# Altium footprint library klp.PcbLib: 436 footprints (part 7 of 28)
Each footprint in its own frame and in the unit in brackets; x right, y up, seen from the top. Pads: shape width x height; smd on the part's side, far side on the other; paste and mask are expansions set on the pad; w line width, h text height; cw(c..) or ccw(c..) is an arc to the next point about the centre after c.
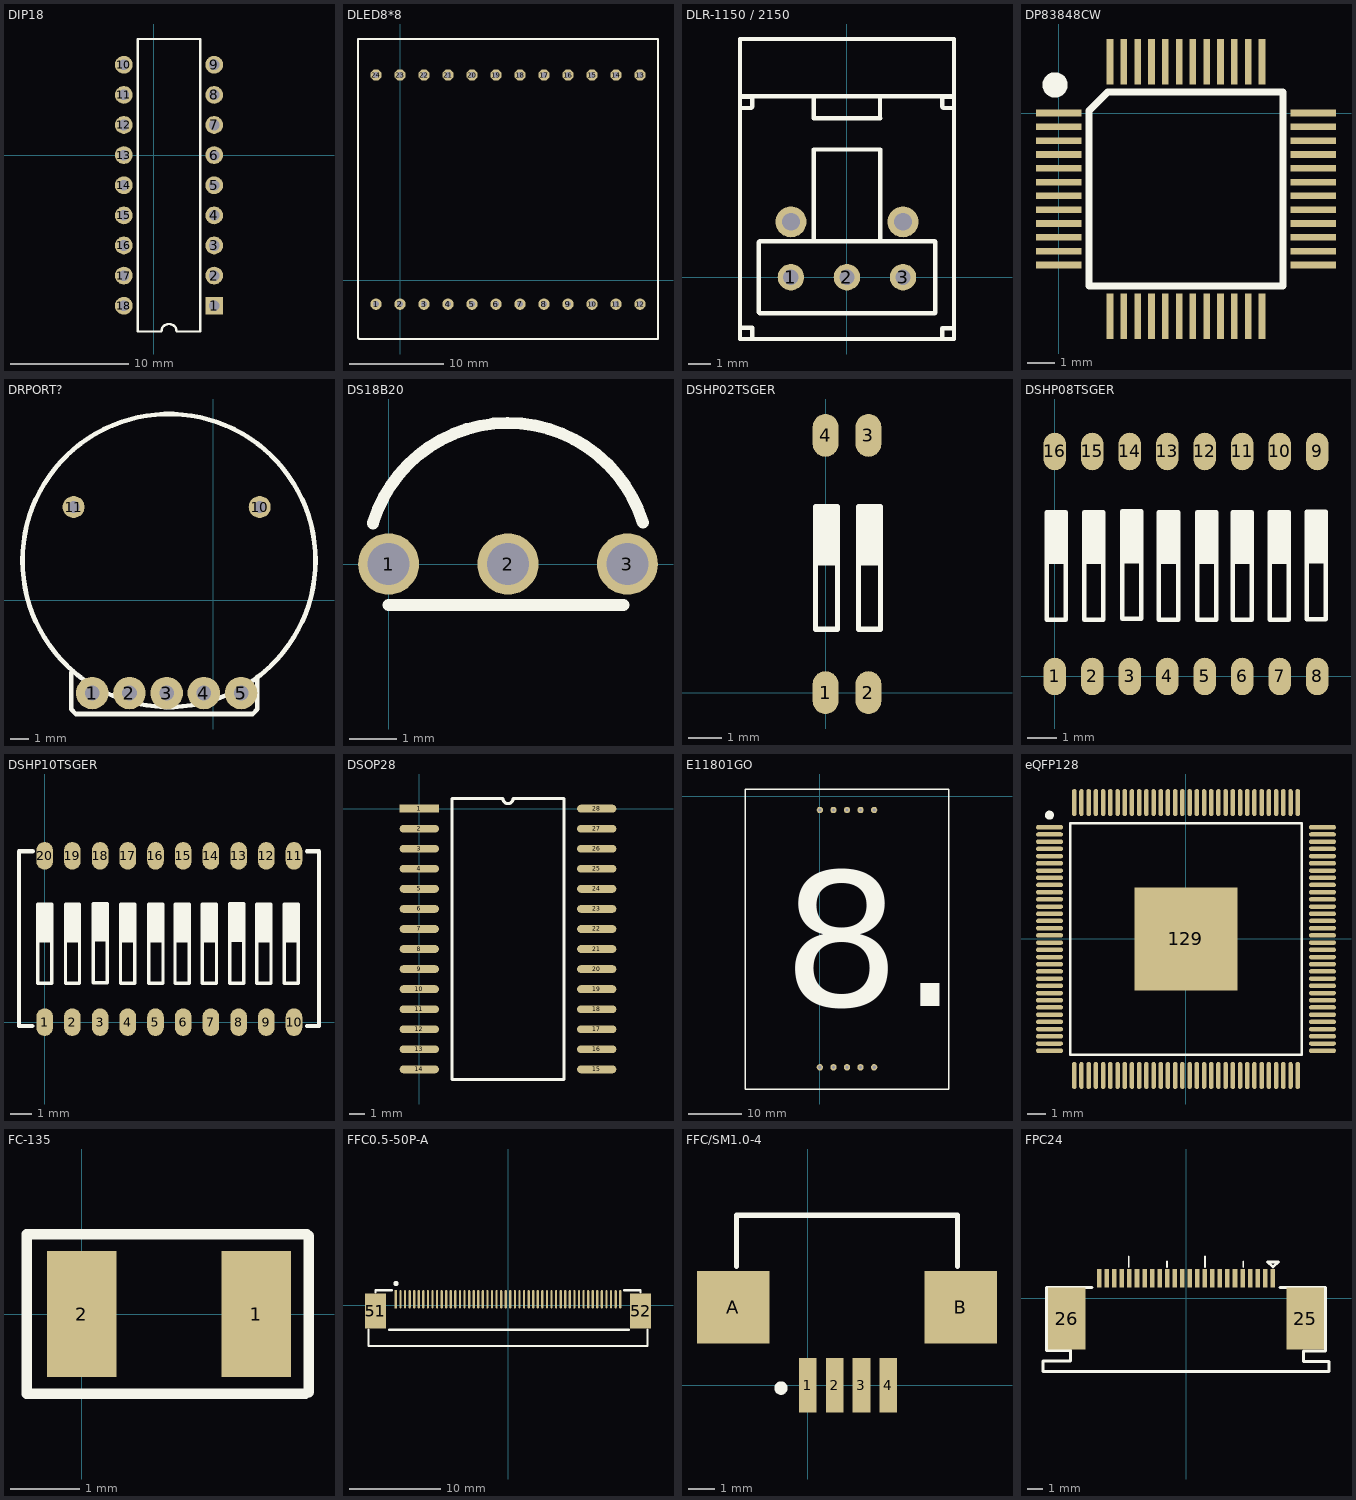
[diagram p6: the footprints below, top view; thin cyan lines are the x and y axes]

## DIP18 [mm] "DIP-18,Row Spacing 7.62 mm; Pitch 2.54 mm"
height 7
pads (18):
  rect 1.5x1.5 hole 0.9: 1(5.08,-12.7)
  round 1.5 hole 0.9: 2(5.08,-10.16) 3(5.08,-7.62) 4(5.08,-5.08) 5(5.08,-2.54) 6(5.08,0) 7(5.08,2.54) 8(5.08,5.08) 9(5.08,7.62) 10(-2.54,7.62) 11(-2.54,5.08) 12(-2.54,2.54) 13(-2.54,0) 14(-2.54,-2.54) 15(-2.54,-5.08) 16(-2.54,-7.62) 17(-2.54,-10.16) 18(-2.54,-12.7)
Top Overlay:
  lines w0.2: -1.38,-14.87 -1.38,9.79 3.92,9.79 3.92,-14.87 1.905,-14.87 ccw(c1.27,-14.87) 0.635,-14.87 -1.38,-14.87

## DLED8*8 [mm]
height 6.7
pads (24):
  round 1.2 hole 0.635: 1(-2.54,-2.54) 2(0,-2.54) 3(2.54,-2.54) 4(5.08,-2.54) 5(7.62,-2.54) 6(10.16,-2.54) 7(12.7,-2.54) 8(15.24,-2.54) 9(17.78,-2.54) 10(20.32,-2.54) 11(22.86,-2.54) 12(25.4,-2.54) 13(25.4,21.717) 14(22.86,21.717) 15(20.32,21.717) 16(17.78,21.717) 17(15.24,21.717) 18(12.7,21.717) 19(10.16,21.717) 20(7.62,21.717) 21(5.08,21.717) 22(2.54,21.717) 23(0,21.717) 24(-2.54,21.717)
Top Overlay:
  lines w0.254: -4.445,-6.096 -4.318,-6.223 -3.302,-6.223 14.859,-6.223 27.305,-6.223 27.305,25.527 -4.445,25.527 -4.445,-6.096

## DLR-1150 / 2150 [mm]
pads (5):
  round 1.2 hole 0.7: 1(-2.54,0) 2(0,0) 3(2.54,0)
  round 1.4 hole 0.8: ""(-2.54,2.51) ""(2.54,2.51)
Top Overlay:
  lines w0.2: -4.85,8.2 4.85,8.2 ; -4.801,8.179 -4.318,8.179 -4.293,8.153 -4.293,7.722 -4.343,7.671 -4.75,7.671 ; -4.75,-2.286 -4.293,-2.286 -4.293,-2.718 ; -1.5,7.2 1.5,7.2 ; -1.499,1.626 -1.499,5.791 1.5,5.791 1.5,1.626 ; -1.499,7.2 -1.499,8.204 ; 1.499,7.2 1.499,8.204 ; 3.988,1.626 -3.962,1.626 -4,1.588 -4,-1.588 -3.962,-1.626 3.988,-1.626 4,-1.613 4,1.6 ; 4.318,-2.794 4.318,-2.311 4.851,-2.311 ; 4.75,7.671 4.369,7.671 4.318,7.722 4.318,8.153 4.343,8.179 4.826,8.179 ; -4.85,-2.8 -4.85,10.8 4.85,10.8 4.85,-2.8 -4.85,-2.8

## DP83848CW [mil]
pads (48):
  rect 65x9.5 smd: 1(0.42,0.29) 2(0.42,-19.39) 3(0.42,-39.08) 4(0.42,-58.76) 5(0.42,-78.45) 6(0.42,-98.13) 7(0.42,-117.82) 8(0.42,-137.5) 9(0.42,-157.19) 10(0.42,-176.87) 11(0.42,-196.56) 12(0.42,-216.24) 25(362.63,-216.24) 26(362.63,-196.56) 27(362.63,-176.87) 28(362.63,-157.19) 29(362.63,-137.5) 30(362.63,-117.82) 31(362.63,-98.13) 32(362.63,-78.45) 33(362.63,-58.76) 34(362.63,-39.08) 35(362.63,-19.39) 36(362.63,0.29)
  rect 9.5x65 smd: 13(73.26,-289.08) 14(92.94,-289.08) 15(112.63,-289.08) 16(132.31,-289.08) 17(152,-289.08) 18(171.68,-289.08) 19(191.37,-289.08) 20(211.05,-289.08) 21(230.74,-289.08) 22(250.42,-289.08) 23(270.11,-289.08) 24(289.79,-289.08) 37(289.79,73.13) 38(270.11,73.13) 39(250.42,73.13) 40(230.74,73.13) 41(211.05,73.13) 42(191.37,73.13) 43(171.68,73.13) 44(152,73.13) 45(132.31,73.13) 46(112.63,73.13) 47(92.94,73.13) 48(73.26,73.13)
Top Overlay:
  circle w25: c-4.93,40.29 r5.35
  lines w10: 43.73,-245.77 319.32,-245.77 319.32,29.82 69.95,29.82 43.73,3.6 43.73,-245.77

## DRPORT? [mil] "DRPORT"
height 30
pads (7):
  round 70 hole 31.5: 1(-260,-200) 2(-180,-200) 3(-100,-200) 4(-20,-200) 5(60,-200)
  round 47.24 hole 25: 10(100,200) 11(-300,200)
Top Overlay:
  circle w10: c-94.96,85 r314.96
  lines w10: -305,-155 -305,-235 -295,-245 85,-245 95,-235 95,-165

## DS18B20 [mm]
height 10
pads (3):
  round 1.3 hole 0.9: 1(0,0) 2(2.54,0) 3(5.08,0)
Top Overlay:
  lines w0.254: -0.333,0.862 cw(c2.54,0) 5.407,0.885 ; 0,-0.875 5,-0.875

## DSHP02TSGER [mm]
pads (4):
  oval 0.76x1.27 smd: 1(0,0) 2(1.27,0) 3(1.27,7.62) 4(0,7.62)
Top Overlay:
  lines w0.152: -0.25,3.836 0.25,3.836 ; -0.25,3.977 0.25,3.977 ; -0.25,4.118 0.25,4.118 ; -0.25,4.259 0.25,4.259 ; -0.25,4.4 0.25,4.4 ; -0.25,4.541 0.25,4.541 ; -0.25,4.682 0.25,4.682 ; -0.25,4.823 0.25,4.823 ; -0.25,4.964 0.25,4.964 ; -0.25,5.104 0.25,5.104 ; -0.25,5.245 0.25,5.245 ; -0.25,5.386 0.25,5.386 ; 1.025,3.836 1.525,3.836 ; 1.025,3.977 1.525,3.977 ; 1.025,4.118 1.525,4.118 ; 1.025,4.259 1.525,4.259 ; 1.025,4.4 1.525,4.4 ; 1.025,4.541 1.525,4.541 ; 1.025,4.682 1.525,4.682 ; 1.025,4.823 1.525,4.823 ; 1.025,4.964 1.525,4.964 ; 1.025,5.104 1.525,5.104 ; 1.025,5.245 1.525,5.245 ; 1.025,5.386 1.525,5.386 ; -0.297,1.875 0.35,1.875 0.35,5.513 -0.297,5.513 -0.297,1.875 ; 0.978,1.875 0.978,5.513 1.625,5.513 1.625,1.875 0.978,1.875
3D body "switch_a-dshp-02.stp": height 1.9, standoff 0, extent -1.18,-0.2 2.4,7.8

## DSHP08TSGER [mm]
pads (16):
  oval 0.76x1.27 smd: 1(0,0) 2(1.27,0) 3(2.54,0) 4(3.81,0) 5(5.08,0) 6(6.35,0) 7(7.62,0) 8(8.89,0) 9(8.89,7.62) 10(7.62,7.62) 11(6.35,7.62) 12(5.08,7.62) 13(3.81,7.62) 14(2.54,7.62) 15(1.27,7.62) 16(0,7.62)
Top Overlay:
  lines w0.152: -0.225,3.886 0.275,3.886 ; -0.225,4.027 0.275,4.027 ; -0.225,4.168 0.275,4.168 ; -0.225,4.309 0.275,4.309 ; -0.225,4.45 0.275,4.45 ; -0.225,4.591 0.275,4.591 ; -0.225,4.732 0.275,4.732 ; -0.225,4.873 0.275,4.873 ; -0.225,5.014 0.275,5.014 ; -0.225,5.154 0.275,5.154 ; -0.225,5.295 0.275,5.295 ; -0.225,5.436 0.275,5.436 ; 1.05,3.886 1.55,3.886 ; 1.05,4.027 1.55,4.027 ; 1.05,4.168 1.55,4.168 ; 1.05,4.309 1.55,4.309 ; 1.05,4.45 1.55,4.45 ; 1.05,4.591 1.55,4.591 ; 1.05,4.732 1.55,4.732 ; 1.05,4.873 1.55,4.873 ; 1.05,5.014 1.55,5.014 ; 1.05,5.154 1.55,5.154 ; 1.05,5.295 1.55,5.295 ; 1.05,5.436 1.55,5.436 ; 2.325,3.911 2.825,3.911 ; 2.325,4.052 2.825,4.052 ; 2.325,4.193 2.825,4.193 ; 2.325,4.334 2.825,4.334 ; 2.325,4.475 2.825,4.475 ; 2.325,4.616 2.825,4.616 ; 2.325,4.757 2.825,4.757 ; 2.325,4.898 2.825,4.898 ; 2.325,5.039 2.825,5.039 ; 2.325,5.179 2.825,5.179 ; 2.325,5.32 2.825,5.32 ; 2.325,5.461 2.825,5.461 ; 3.575,3.886 4.075,3.886 ; 3.575,4.027 4.075,4.027 ; 3.575,4.168 4.075,4.168 ; 3.575,4.309 4.075,4.309 ; 3.575,4.45 4.075,4.45 ; 3.575,4.591 4.075,4.591 ; 3.575,4.732 4.075,4.732 ; 3.575,4.873 4.075,4.873 ; 3.575,5.014 4.075,5.014 ; 3.575,5.154 4.075,5.154 ; 3.575,5.295 4.075,5.295 ; 3.575,5.436 4.075,5.436 ; 4.875,3.886 5.375,3.886 ; 4.875,4.027 5.375,4.027 ; 4.875,4.168 5.375,4.168 ; 4.875,4.309 5.375,4.309 ; 4.875,4.45 5.375,4.45 ; 4.875,4.591 5.375,4.591 ; 4.875,4.732 5.375,4.732 ; 4.875,4.873 5.375,4.873 ; 4.875,5.014 5.375,5.014 ; 4.875,5.154 5.375,5.154 ; 4.875,5.295 5.375,5.295 ; 4.875,5.436 5.375,5.436 ; 6.075,3.886 6.575,3.886 ; 6.075,4.027 6.575,4.027 ; 6.075,4.168 6.575,4.168 ; 6.075,4.309 6.575,4.309 ; 6.075,4.45 6.575,4.45 ; 6.075,4.591 6.575,4.591 ; 6.075,4.732 6.575,4.732 ; 6.075,4.873 6.575,4.873 ; 6.075,5.014 6.575,5.014 ; 6.075,5.154 6.575,5.154 ; 6.075,5.295 6.575,5.295 ; 6.075,5.436 6.575,5.436 ; 7.325,3.886 7.825,3.886 ; 7.325,4.027 7.825,4.027 ; 7.325,4.168 7.825,4.168 ; 7.325,4.309 7.825,4.309 ; 7.325,4.45 7.825,4.45 ; 7.325,4.591 7.825,4.591 ; 7.325,4.732 7.825,4.732 ; 7.325,4.873 7.825,4.873 ; 7.325,5.014 7.825,5.014 ; 7.325,5.154 7.825,5.154 ; 7.325,5.295 7.825,5.295 ; 7.325,5.436 7.825,5.436 ; 8.575,3.9 9.075,3.9 ; 8.575,4.041 9.075,4.041 ; 8.575,4.182 9.075,4.182 ; 8.575,4.323 9.075,4.323 ; 8.575,4.464 9.075,4.464 ; 8.575,4.605 9.075,4.605 ; 8.575,4.745 9.075,4.745 ; 8.575,4.886 9.075,4.886 ; 8.575,5.027 9.075,5.027 ; 8.575,5.168 9.075,5.168 ; 8.575,5.309 9.075,5.309 ; 8.575,5.45 9.075,5.45 ; -0.272,1.925 -0.272,5.563 0.375,5.563 0.375,1.925 -0.272,1.925 ; 1.003,1.925 1.65,1.925 1.65,5.563 1.003,5.563 1.003,1.925 ; 2.278,1.95 2.925,1.95 2.925,5.588 2.278,5.588 2.278,1.95 ; 3.528,1.925 4.175,1.925 4.175,5.563 3.528,5.563 3.528,1.925 ; 4.828,1.925 5.475,1.925 5.475,5.563 4.828,5.563 4.828,1.925 ; 6.028,1.925 6.675,1.925 6.675,5.563 6.028,5.563 6.028,1.925 ; 7.278,1.925 7.925,1.925 7.925,5.563 7.278,5.563 7.278,1.925 ; 8.528,1.939 9.175,1.939 9.175,5.577 8.528,5.577 8.528,1.939
3D body "switch_a-dshp-08.stp": height 1.9, standoff 0, extent -1.175,-0.175 10.025,7.825

## DSHP10TSGER [mm]
pads (20):
  oval 0.76x1.27 smd: 1(0,0) 2(1.27,0) 3(2.54,0) 4(3.81,0) 5(5.08,0) 6(6.35,0) 7(7.62,0) 8(8.89,0) 9(10.16,0) 10(11.43,0) 11(11.43,7.62) 12(10.16,7.62) 13(8.89,7.62) 14(7.62,7.62) 15(6.35,7.62) 16(5.08,7.62) 17(3.81,7.62) 18(2.54,7.62) 19(1.27,7.62) 20(0,7.62)
Top Overlay:
  drawing of 166 lines, arcs and shapes, not listed
3D body "switch_a-dshp-10.stp": height 1.9, standoff 0, extent -1.17,-0.175 12.57,7.825

## DSOP28 [mm] "DSIZE"
height 1
pads (28):
  rect 2.5x0.5 smd: 1(0,0)
  oval 2.5x0.5 smd: 2(0,-1.277) 3(0,-2.554) 4(0,-3.831) 5(0,-5.108) 6(0,-6.385) 7(0,-7.662) 8(0,-8.939) 9(0,-10.216) 10(0,-11.493) 11(0,-12.77) 12(0,-14.047) 13(0,-15.324) 14(0,-16.601) 15(11.3,-16.601) 16(11.3,-15.324) 17(11.3,-14.047) 18(11.3,-12.77) 19(11.3,-11.493) 20(11.3,-10.216) 21(11.3,-8.939) 22(11.3,-7.662) 23(11.3,-6.385) 24(11.3,-5.108) 25(11.3,-3.831) 26(11.3,-2.554) 27(11.3,-1.277) 28(11.3,0)
Top Overlay:
  lines w0.2: 2.085,-17.24 2.085,0.639 5.331,0.639 ccw(c5.65,0.639) 5.969,0.639 9.215,0.639 9.215,-17.24 2.085,-17.24

## E11801GO [mm] "E11801GO"
height 1.016
pads (10):
  round 1.2 hole 0.635: 1(0,-2.54) 2(2.54,-2.54) 3(5.08,-2.54) 4(7.62,-2.54) 5(10.16,-2.54) 6(10.16,-50.8) 7(7.62,-50.8) 8(5.08,-50.8) 9(2.54,-50.8) 10(0,-50.8)
Top Overlay:
  lines w0.254: -10.16,1.397 22.86,1.397 24.13,1.397 24.13,-28.448 24.13,-54.864 -13.97,-54.864 -13.97,-38.862 -13.97,1.397 -9.906,1.397
  text "8." at -6.985,-39.37 h25.4

## eQFP128 [mm] "TSQFP, 128-Leads, Body 14.00x14.00mm, Pitch 0.40mm, Thermal Pad 5.70x5.70mm, IPC High Density"
height 1.6
pads (129):
  oval 1.5x0.25 smd: 1(-7.575,6.2) 2(-7.575,5.8) 3(-7.575,5.4) 4(-7.575,5) 5(-7.575,4.6) 6(-7.575,4.2) 7(-7.575,3.8) 8(-7.575,3.4) 9(-7.575,3) 10(-7.575,2.6) 11(-7.575,2.2) 12(-7.575,1.8) 13(-7.575,1.4) 14(-7.575,1) 15(-7.575,0.6) 16(-7.575,0.2) 17(-7.575,-0.2) 18(-7.575,-0.6) 19(-7.575,-1) 20(-7.575,-1.4) 21(-7.575,-1.8) 22(-7.575,-2.2) 23(-7.575,-2.6) 24(-7.575,-3) 25(-7.575,-3.4) 26(-7.575,-3.8) 27(-7.575,-4.2) 28(-7.575,-4.6) 29(-7.575,-5) 30(-7.575,-5.4) 31(-7.575,-5.8) 32(-7.575,-6.2) 65(7.575,-6.2) 66(7.575,-5.8) 67(7.575,-5.4) 68(7.575,-5) 69(7.575,-4.6) 70(7.575,-4.2) 71(7.575,-3.8) 72(7.575,-3.4) 73(7.575,-3) 74(7.575,-2.6) 75(7.575,-2.2) 76(7.575,-1.8) 77(7.575,-1.4) 78(7.575,-1) 79(7.575,-0.6) 80(7.575,-0.2) 81(7.575,0.2) 82(7.575,0.6) 83(7.575,1) 84(7.575,1.4) 85(7.575,1.8) 86(7.575,2.2) 87(7.575,2.6) 88(7.575,3) 89(7.575,3.4) 90(7.575,3.8) 91(7.575,4.2) 92(7.575,4.6) 93(7.575,5) 94(7.575,5.4) 95(7.575,5.8) 96(7.575,6.2)
  oval 0.25x1.5 smd: 33(-6.2,-7.575) 34(-5.8,-7.575) 35(-5.4,-7.575) 36(-5,-7.575) 37(-4.6,-7.575) 38(-4.2,-7.575) 39(-3.8,-7.575) 40(-3.4,-7.575) 41(-3,-7.575) 42(-2.6,-7.575) 43(-2.2,-7.575) 44(-1.8,-7.575) 45(-1.4,-7.575) 46(-1,-7.575) 47(-0.6,-7.575) 48(-0.2,-7.575) 49(0.2,-7.575) 50(0.6,-7.575) 51(1,-7.575) 52(1.4,-7.575) 53(1.8,-7.575) 54(2.2,-7.575) 55(2.6,-7.575) 56(3,-7.575) 57(3.4,-7.575) 58(3.8,-7.575) 59(4.2,-7.575) 60(4.6,-7.575) 61(5,-7.575) 62(5.4,-7.575) 63(5.8,-7.575) 64(6.2,-7.575) 97(6.2,7.575) 98(5.8,7.575) 99(5.4,7.575) 100(5,7.575) 101(4.6,7.575) 102(4.2,7.575) 103(3.8,7.575) 104(3.4,7.575) 105(3,7.575) 106(2.6,7.575) 107(2.2,7.575) 108(1.8,7.575) 109(1.4,7.575) 110(1,7.575) 111(0.6,7.575) 112(0.2,7.575) 113(-0.2,7.575) 114(-0.6,7.575) 115(-1,7.575) 116(-1.4,7.575) 117(-1.8,7.575) 118(-2.2,7.575) 119(-2.6,7.575) 120(-3,7.575) 121(-3.4,7.575) 122(-3.8,7.575) 123(-4.2,7.575) 124(-4.6,7.575) 125(-5,7.575) 126(-5.4,7.575) 127(-5.8,7.575) 128(-6.2,7.575)
  rect 5.7x5.7 smd: 129(0,0)
Top Overlay:
  circle w0.25: c-7.575,6.875 r0.125
  lines w0.13: -6.425,-6.425 -6.425,6.425 6.425,6.425 6.425,-6.425 -6.425,-6.425
3D body: height 1.6, standoff 0.05, extent -7,-7 7,7

## FC-135 [mm] "FC135与FC-13F封装大小相同，只是实体厚度不同"
pads (2):
  rect 1x1.8 smd: 1(2.5,0) 2(0,0)
Top Overlay:
  lines w0.152: 3.2,-1.143 -0.787,-1.143 -0.787,1.143 3.226,1.143 ; 3.251,-1.118 3.251,1.118

## FFC0.5-50P-A [mm]
pads (52):
  rect 0.25x2 smd: 1(-12.246,0.645)
  oval 0.25x2 smd: 2(-11.746,0.645) 3(-11.246,0.645) 4(-10.746,0.645) 5(-10.246,0.645) 6(-9.746,0.645) 7(-9.246,0.645) 8(-8.746,0.645) 9(-8.246,0.645) 10(-7.746,0.645) 11(-7.246,0.645) 12(-6.746,0.645) 13(-6.246,0.645) 14(-5.746,0.645) 15(-5.246,0.645) 16(-4.746,0.645) 17(-4.246,0.645) 18(-3.746,0.645) 19(-3.246,0.645) 20(-2.746,0.645) 21(-2.246,0.645) 22(-1.746,0.645) 23(-1.246,0.645) 24(-0.746,0.645) 25(-0.246,0.645) 26(0.254,0.645) 27(0.754,0.645) 28(1.254,0.645) 29(1.754,0.645) 30(2.254,0.645) 31(2.754,0.645) 32(3.254,0.645) 33(3.754,0.645) 34(4.254,0.645) 35(4.754,0.645) 36(5.254,0.645) 37(5.754,0.645) 38(6.254,0.645) 39(6.754,0.645) 40(7.254,0.645) 41(7.754,0.645) 42(8.254,0.645) 43(8.754,0.645) 44(9.254,0.645) 45(9.754,0.645) 46(10.254,0.645) 47(10.754,0.645) 48(11.254,0.645) 49(11.754,0.645) 50(12.254,0.645)
  rect 2.286x3.81 smd: 51(-14.478,-0.645) 52(14.478,-0.645)
Top Overlay:
  circle w0.254: c-12.228,2.362 r0.163
  lines w0.254: -15.24,-2.677 -15.24,-4.455 15.24,-4.455 15.24,-2.677 ; -14.478,1.387 -14.478,1.641 -12.7,1.641 ; -12.954,-2.677 13.208,-2.677 ; 12.7,1.641 14.478,1.641 14.478,1.387

## FFC/SM1.0-4 [mil]
pads (6):
  rect 26x80 smd: 1(0,0) 2(39.37,0) 3(78.74,0) 4(118.11,0)
  rect 106.3x106.3 smd: A(-110,115) B(225,115)
Top Overlay:
  circle w9.84: c-39.63,-4 r4.92
  lines w8: -105,175 -105,250 220,250 220,175

## FPC24 [mm]
pads (26):
  rect 0.3x1.25 smd: 1(5.75,1.338) 2(5.25,1.338) 3(4.75,1.338) 4(4.25,1.338) 5(3.75,1.338) 6(3.25,1.338) 7(2.75,1.338) 8(2.25,1.338) 9(1.75,1.338) 10(1.25,1.338) 11(0.75,1.338) 12(0.25,1.338) 13(-0.25,1.338) 14(-0.75,1.338) 15(-1.25,1.338) 16(-1.75,1.338) 17(-2.25,1.338) 18(-2.75,1.338) 19(-3.25,1.338) 20(-3.75,1.338) 21(-4.25,1.338) 22(-4.75,1.338) 23(-5.25,1.338) 24(-5.75,1.338)
  rect 2.5x4.1 smd: 25(7.9,-1.337) 26(-7.9,-1.337)
Top Overlay:
  lines w0.127: -3.8,2.088 -3.8,2.788 ; -1.25,2.088 -1.25,2.438 ; 1.25,2.088 1.25,2.788 ; 3.8,2.088 3.8,2.438
  lines w0.2: -6.25,0.713 -9.25,0.713 -9.25,-3.442 -7.65,-3.442 -7.65,-4.162 -9.5,-4.162 -9.5,-4.862 9.5,-4.862 9.5,-4.192 7.79,-4.192 7.79,-3.482 9.25,-3.482 9.25,0.713 6.25,0.713 ; 5.423,2.428 5.776,2.074 6.13,2.428 5.423,2.428
3D body "ffc_fpc_affc20-24-050-shb-t.stp": height 2.15, standoff 0.05, extent -8.75,-4.05 8.75,1.286